# Altium footprint library UWRT_Footprint_Library_2020.PcbLib: 376 footprints (part 8 of 24)
Each footprint in its own frame and in the unit in brackets; x right, y up, seen from the top. Pads: shape width x height; smd on the part's side, far side on the other; paste and mask are expansions set on the pad; w line width, h text height; cw(c..) or ccw(c..) is an arc to the next point about the centre after c.
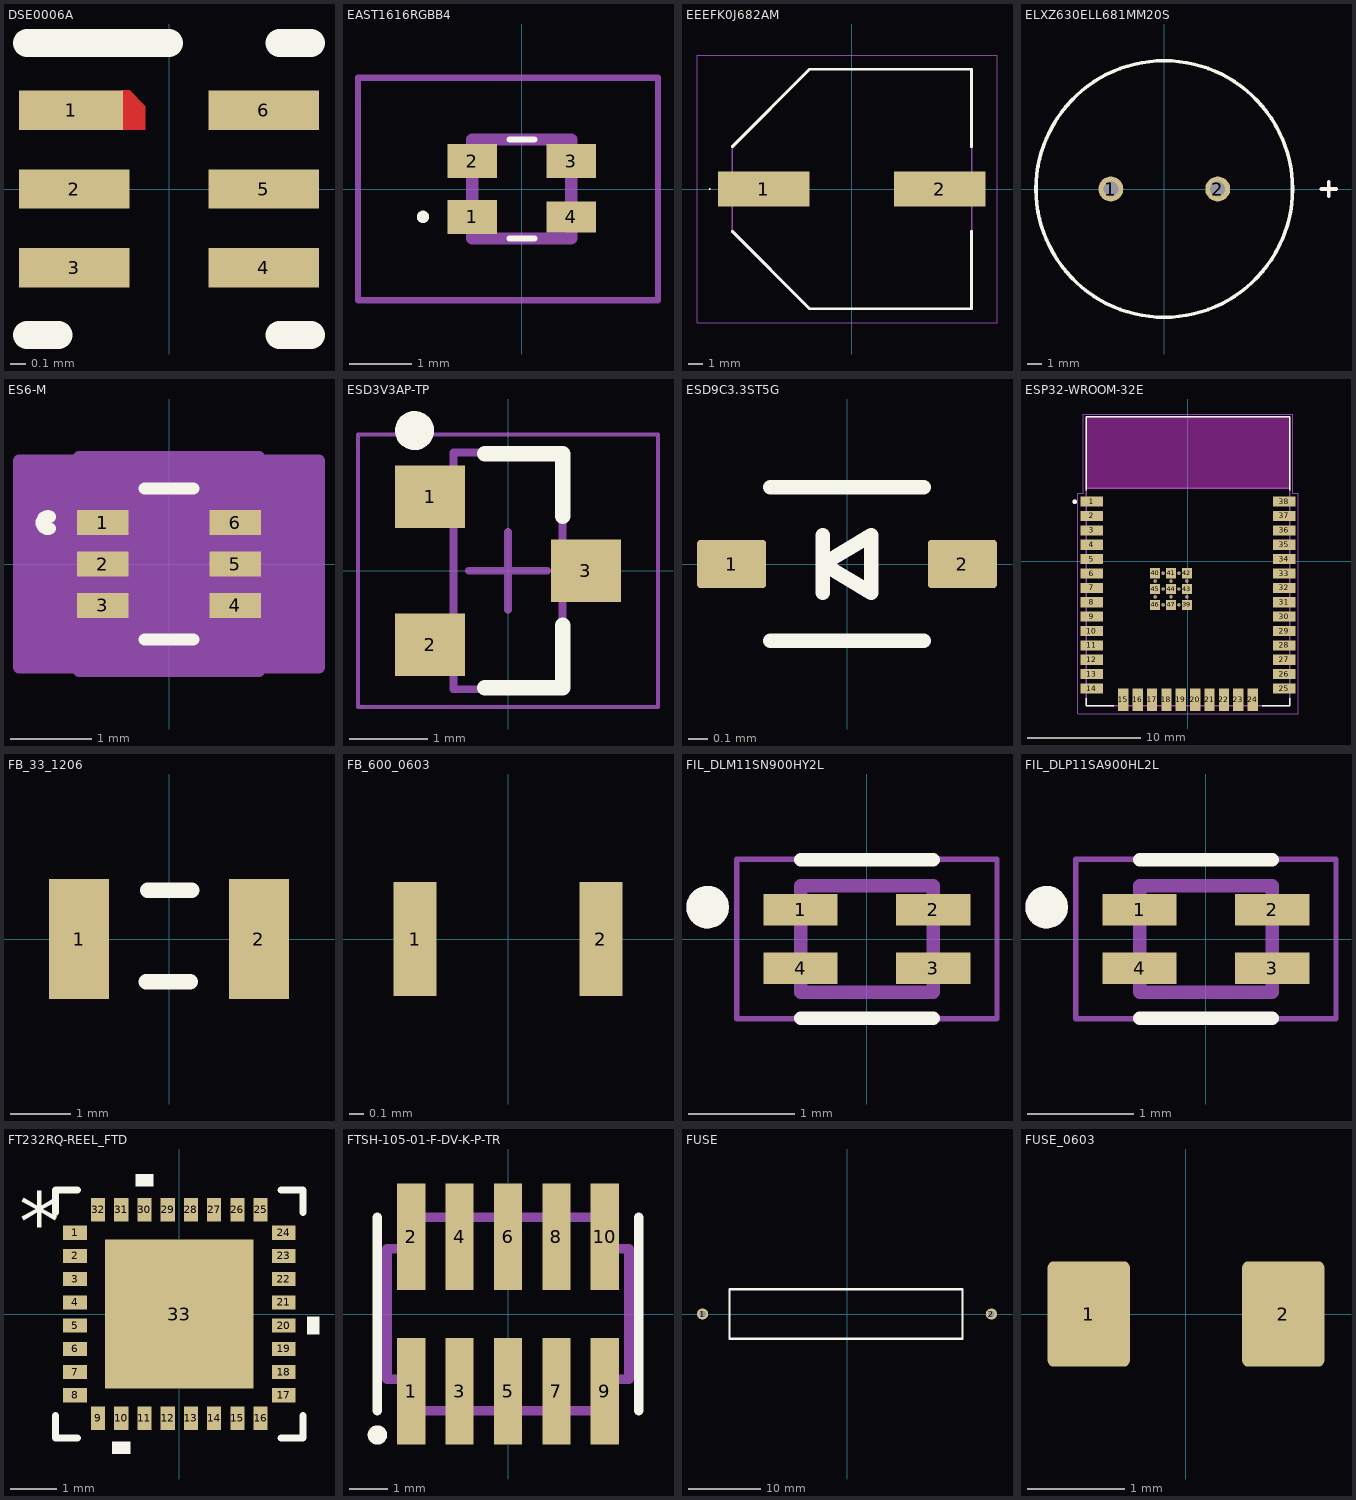
[diagram p7: the footprints below, top view; thin cyan lines are the x and y axes]

## DSE0006A [mm]
pads (6):
  rect 0.66x0.25 smd paste+0 mask+0.051: 1(-0.62,0.5)
  rect 0.7x0.25 smd paste+0 mask+0.051: 2(-0.6,0) 3(-0.6,-0.5) 4(0.6,-0.5) 5(0.6,0) 6(0.6,0.5)
Top Layer:
  region: -0.3,0.375 -0.3,0.625 -0.25,0.625 -0.15,0.525 -0.15,0.375
Top Overlay:
  lines w0.178: -0.9,-0.925 -0.7,-0.925 ; -0.9,0.925 0,0.925 ; 0.7,-0.925 0.9,-0.925 ; 0.7,0.925 0.9,0.925
Top Paste:
  region: -0.3,0.375 -0.3,0.625 -0.25,0.625 -0.15,0.525 -0.15,0.375
Top Solder:
  region: -0.351,0.375 -0.351,0.625 -0.35,0.635 -0.347,0.644 -0.342,0.653 -0.336,0.661 -0.328,0.667 -0.319,0.672 -0.31,0.675 -0.3,0.676 -0.25,0.676 -0.24,0.675 -0.231,0.672 -0.222,0.667 -0.214,0.661 -0.114,0.561 -0.108,0.553 -0.103,0.544 -0.1,0.535 -0.099,0.525 -0.099,0.375 -0.1,0.365 -0.103,0.356 -0.108,0.347 -0.114,0.339 -0.122,0.333 -0.131,0.328 -0.14,0.325 -0.15,0.324 -0.3,0.324 -0.31,0.325 -0.319,0.328 -0.328,0.333 -0.336,0.339 -0.342,0.347 -0.347,0.356 -0.35,0.365

## EAST1616RGBB4 [mm]
pads (4):
  rect 0.8x0.55 smd: 1(-0.8,-0.45) 2(-0.8,0.45) 3(0.8,0.45)
  rect 0.8x0.5 smd: 4(0.8,-0.45)
Top Overlay:
  lines w0.1: -0.2,-0.8 0.2,-0.8 ; -0.2,0.8 0.2,0.8 ; -1.6,-0.5 cw(c-1.6,-0.45) -1.6,-0.4 cw(c-1.6,-0.45) -1.6,-0.5
Mechanical 13:
  lines w0.2: -0.8,-0.8 0.8,-0.8 0.8,0.8 -0.8,0.8 -0.8,-0.8
Mechanical 15:
  lines w0.1: -2.65,-1.8 2.2,-1.8 2.2,1.8 -2.65,1.8 -2.65,-1.8
3D body "EAST1616RGBB4.stp": height 0.45, standoff 0, extent -0.8,-0.8 0.8,0.8

## EEEFK0J682AM [mm]
pads (2):
  rect 6.5x2.5 smd: 1(-6.25,0) 2(6.25,0)
Top Overlay:
  lines w0.05: -10.125,0 cw(c-10.1,0) -10.075,0 cw(c-10.1,0) -10.125,0
  lines w0.2: -8.5,-3 -3,-8.5 8.5,-8.5 8.5,-3 ; -8.5,3 -3,8.5 8.5,8.5 8.5,3
Mechanical 13:
  lines w0.1: -8.5,3 -3,8.5 ; -8.5,3 -8.5,-3 -3,-8.5 8.5,-8.5 8.5,8.5 -3,8.5 ; -8.5,3 -3,8.5
Mechanical 15:
  lines w0.05: -11,-9.5 -11,9.5 10.3,9.5 10.3,-9.5 -11,-9.5
3D body "EEV-FK1K331M.STEP": height 16.5, standoff 0, extent -9,-8.4 9.4,8.6
3D body "EEV-FK1K331M.stp": height 0, standoff 0, extent 0,0 0,0

## ELXZ630ELL681MM20S [mm] "CAP ALUM 680UF 20% 63V RADIAL"
pads (2):
  round 1.75 hole 1.05: 1(-3.75,0) 2(3.75,0)
Top Overlay:
  circle w0.254: c0,0 r9
  lines w0.254: 11.032,0 12.048,0 ; 11.54,-0.508 11.54,0.508

## ES6-M [mil]
pads (6):
  rect 25x12 smd paste+0 mask+0: 1(-32,20) 2(-32,0) 3(-32,-20) 4(32,-20) 5(32,0) 6(32,20)
Top Overlay:
  lines w6: -57.6,17.14 cw(c-58.5,20) -57.6,22.86 ; -11.67,-36.5 11.67,-36.5 ; -11.67,36.5 11.67,36.5
Mechanical 5:
  region: 59.5,-46.5 -59.5,-46.5 -59.5,46.5 59.5,46.5
Mechanical 13:
  circle w0: c-19.5,20 r3
  lines w0: -12,31.5 ccw(c0,31.5) 12,31.5
  lines w1: -23.5,-31.5 23.5,-31.5 23.5,31.5 -23.5,31.5 -23.5,-31.5
Mechanical 15:
  region: 43.5,-51.5 -43.5,-51.5 -43.5,-50 -72.5,-50 -72.5,50 -43.5,50 -43.5,51.5 43.5,51.5 43.5,50 72.5,50 72.5,-50 43.5,-50
  lines w6: -72.5,-50 -43.5,-50 -43.5,-51.5 43.5,-51.5 43.5,-50 72.5,-50 72.5,50 43.5,50 43.5,51.5 -43.5,51.5 -43.5,50 -72.5,50 -72.5,-50
3D body "ES6_z90.stp": height 21.65, standoff 0, extent -31.5,-31.5 31.5,31.5
3D body: height 10, standoff 0, extent 0,0 10,10

## ESD3V3AP-TP [mm] "TVS DIODE 3.3VWM 7.5VC SOT23"
height 1.1
pads (3):
  rect 0.9x0.8 smd: 1(-1,0.95) 2(-1,-0.95) 3(1,0)
Top Overlay:
  circle w0.25: c-1.2,1.8 r0.125
  lines w0.2: -0.3,-1.5 0.7,-1.5 0.7,-0.7 ; -0.3,1.5 0.7,1.5 0.7,0.7
Mechanical 13:
  lines w0.1: -0.7,-1.52 0.7,-1.52 0.7,1.52 -0.7,1.52 -0.7,-1.52
Mechanical 15:
  lines w0.05: -1.925,-1.75 1.925,-1.75 1.925,1.75 -1.925,1.75 -1.925,-1.75
  lines w0.1: -0.5,0 0.5,0 ; 0,-0.5 0,0.5
3D body "ESD3V3AP-TP.step": height 1.1, standoff 0, extent -1.32,-1.52 1.32,1.52

## ESD9C3.3ST5G [mm]
pads (2):
  rrect15% 0.36x0.25 smd mask+0.05: 1(-0.6,0) 2(0.6,0)
Top Overlay:
  lines w0.075: -0.4,-0.4 0.4,-0.4 ; -0.4,0.4 0.4,0.4 ; -0.125,-0.15 -0.125,0.15 ; -0.125,0 0.125,-0.15 0.125,0.15 -0.125,0
3D body "SOD-923.step": height 0.43, standoff 0, extent -0.525,-0.325 0.525,0.325

## ESP32-WROOM-32E [mm]
pads (59):
  rect 2x0.9 smd: 1(-8.5,5.26) 2(-8.5,3.99) 3(-8.5,2.72) 4(-8.5,1.45) 5(-8.5,0.18) 6(-8.5,-1.09) 7(-8.5,-2.36) 8(-8.5,-3.63) 9(-8.5,-4.9) 10(-8.5,-6.17) 11(-8.5,-7.44) 12(-8.5,-8.71) 13(-8.5,-9.98) 14(-8.5,-11.25) 25(8.5,-11.25) 26(8.5,-9.98) 27(8.5,-8.71) 28(8.5,-7.44) 29(8.5,-6.17) 30(8.5,-4.9) 31(8.5,-3.63) 32(8.5,-2.36) 33(8.5,-1.09) 34(8.5,0.18) 35(8.5,1.45) 36(8.5,2.72) 37(8.5,3.99) 38(8.5,5.26)
  rect 0.9x2 smd: 15(-5.715,-12.25) 16(-4.445,-12.25) 17(-3.175,-12.25) 18(-1.905,-12.25) 19(-0.635,-12.25) 20(0.635,-12.25) 21(1.905,-12.25) 22(3.175,-12.25) 23(4.445,-12.25) 24(5.715,-12.25)
  rect 0.9x0.9 smd: 39(-0.1,-3.86) 40(-2.9,-1.06) 41(-1.5,-1.06) 42(-0.1,-1.06) 43(-0.1,-2.46) 44(-1.5,-2.46) 45(-2.9,-2.46) 46(-2.9,-3.86) 47(-1.5,-3.86)
  round 0.3 hole 0.2: 39_10(-2.2,-1.06) 39_11(-0.8,-1.06) 39_12(-2.9,-1.76) 39_13(-1.5,-1.76) 39_14(-0.1,-1.76) 39_15(-2.2,-2.46) 39_16(-0.8,-2.46) 39_17(-2.9,-3.157) 39_18(-1.5,-3.157) 39_19(-0.1,-3.157) 39_20(-2.2,-3.86) 39_21(-0.8,-3.86)
Top Overlay:
  circle w0.2: c-10,5.25 r0.1
  lines w0.127: -9,-12.1 -9,-12.75 -6.55,-12.75 ; -9,6.25 -9,12.75 9,12.75 9,6.25 ; 6.55,-12.75 9,-12.75 9,-12.1
Keep-Out Layer:
  region: 9,6.45 -9,6.45 -9,12.75 9,12.75
  region: 9,6.45 -9,6.45 -9,12.75 9,12.75
Mechanical 13:
  circle w0.2: c-10,5.25 r0.1
  lines w0.127: -9,6.45 -9,-12.75 9,-12.75 9,6.45 ; -9,6.45 -9,12.75 9,12.75 9,6.45 ; -9,6.45 9,6.45
  text "ANTENNA" at -6,9 h1.78
Mechanical 15:
  lines w0.05: -9.75,-13.5 9.75,-13.5 9.75,6 9.25,6 9.25,13 -9.25,13 -9.25,6 -9.75,6 -9.75,-13.5
3D body "User Library-ESP32-WROOM.step": height 2.91, standoff -0.01, extent -9.111,-12.688 8.889,12.812

## FB_33_1206 [mm]
pads (2):
  rect 1x2 smd: 1(-1.5,0) 2(1.5,0)
Top Overlay:
  lines w0.254: -0.382,-0.711 0.354,-0.711 ; -0.357,0.813 0.38,0.813

## FB_600_0603 [mm] "FERRITE BEAD 600 OHM 0603 1LN"
pads (2):
  rect 0.3x0.8 smd: 1(-0.65,0) 2(0.65,0)
3D body "User Library-FB_1608.STEP": height 0.8, standoff 0, extent -0.8,-0.4 0.8,0.4

## FIL_DLM11SN900HY2L [mm]
pads (4):
  rect 0.7x0.3 smd: 1(-0.625,0.275) 2(0.625,0.275) 3(0.625,-0.275) 4(-0.625,-0.275)
Top Overlay:
  circle w0.2: c-1.5,0.3 r0.1
  lines w0.127: -0.625,-0.745 0.625,-0.745 ; -0.625,0.745 0.625,0.745
Mechanical 13:
  circle w0.2: c-1.5,0.3 r0.1
  lines w0.127: -0.625,-0.5 0.625,-0.5 0.625,0.5 -0.625,0.5 -0.625,-0.5
Mechanical 15:
  lines w0.05: -1.225,-0.75 1.225,-0.75 1.225,0.75 -1.225,0.75 -1.225,-0.75
3D body "DLM11SN900HY2L.STEP": height 0.6, standoff 0, extent -0.625,-0.5 0.625,0.5

## FIL_DLP11SA900HL2L [mm]
pads (4):
  rect 0.7x0.3 smd: 1(-0.625,0.275) 2(0.625,0.275) 3(0.625,-0.275) 4(-0.625,-0.275)
Top Overlay:
  circle w0.2: c-1.5,0.3 r0.1
  lines w0.127: -0.625,-0.745 0.625,-0.745 ; -0.625,0.745 0.625,0.745
Mechanical 13:
  circle w0.2: c-1.5,0.3 r0.1
  lines w0.127: -0.625,-0.5 -0.625,0.5 0.625,0.5 0.625,-0.5 -0.625,-0.5
Mechanical 15:
  lines w0.05: -1.225,-0.75 -1.225,0.75 1.225,0.75 1.225,-0.75 -1.225,-0.75
3D body "step_temp.STEP": height 0.92, standoff 0, extent -0.625,-0.5 0.625,0.5

## FT232RQ-REEL_FTD [mil]
pads (33):
  rect 20x12 smd paste+0 mask+0: 1(-88.43,68.9) 2(-88.43,49.21) 3(-88.43,29.53) 4(-88.43,9.84) 5(-88.43,-9.84) 6(-88.43,-29.53) 7(-88.43,-49.21) 8(-88.43,-68.9) 17(88.43,-68.9) 18(88.43,-49.21) 19(88.43,-29.53) 20(88.43,-9.84) 21(88.43,9.84) 22(88.43,29.53) 23(88.43,49.21) 24(88.43,68.9)
  rect 12x20 smd paste+0 mask+0: 9(-68.9,-88.43) 10(-49.21,-88.43) 11(-29.53,-88.43) 12(-9.84,-88.43) 13(9.84,-88.43) 14(29.53,-88.43) 15(49.21,-88.43) 16(68.9,-88.43) 25(68.9,88.43) 26(49.21,88.43) 27(29.53,88.43) 28(9.84,88.43) 29(-9.84,88.43) 30(-29.53,88.43) 31(-49.21,88.43) 32(-68.9,88.43)
  rect 126x126 smd paste-62.5 mask+0: 33(0,0)
Top Overlay:
  region: -22.03,108.43 -37.03,108.43 -37.03,118.43 -22.03,118.43
  region: 108.43,-2.34 118.43,-2.34 118.43,-17.34 108.43,-17.34
  region: -41.71,-108.43 -56.71,-108.43 -56.71,-118.43 -41.71,-118.43
  lines w6: -105,-86.23 -105,-105 -86.23,-105 ; -105,86.23 -105,105 -86.23,105 ; 86.23,-105 105,-105 105,-86.23 ; 86.23,105 105,105 105,86.23
  text "*" at -135.93,53.74 h50
Top Paste:
  region: 59.06,-3.94 3.94,-3.94 3.94,-59.06 59.06,-59.06
  region: 59.06,59.06 3.94,59.06 3.94,3.94 59.06,3.94
  region: -3.94,-3.94 -59.06,-3.94 -59.06,-59.06 -3.94,-59.06
  region: -3.94,59.06 -59.06,59.06 -59.06,3.94 -3.94,3.94
3D body "FT232RQ-REEL_FTD.step": height 65.12, standoff 0, extent -99.99,-99.99 100.01,100.01

## FTSH-105-01-F-DV-K-P-TR [mil] "Samtec programming header 10 positions"
pads (10):
  rect 29x110 smd mask+2: 1(-100,-80) 2(-100,80) 3(-50,-80) 4(-50,80) 5(0,-80) 6(0,80) 7(50,-80) 8(50,80) 9(100,-80) 10(100,80)
Top Overlay:
  circle w10: c-135,-125 r5
  lines w10: -135,-100 -135,100 ; 135,-100 135,100
Mechanical 1:
  lines w10: -125,-67.5 -100,-67.5 -100,-100 100,-100 100,-67.5 125,-67.5 125,67.5 100,67.5 100,100 -100,100 -100,67.5 -125,67.5 -125,-67.5
3D body "FTSH-105-01-F-DV-K-P-TR.stp": height 275.5, standoff 0.5, extent -125,-175.01 124.99,115

## FUSE [mm] "0324015.HXP"
pads (2):
  round 1.55 hole 0.9: 1(-20,0) 2(20,0)
Top Overlay:
  lines w0.305: -16.256,-3.429 16.012,-3.429 16.012,3.429 -16.256,3.429 -16.256,-3.429
3D body "User Library-Fuse-2.STEP": height 6.36, standoff 0.01, extent -16.002,-3.175 15.758,3.175

## FUSE_0603 [mm] "Chip Fuse, Body 1.6x0.81mm"
height 0.305
pads (2):
  rrect15% 0.85x1.09 smd: 1(-1.005,0) 2(1.005,0)
3D body "User Library-ptc06032-1.STEP": height 0.75, standoff 0, extent -0.8,-0.375 0.8,0.375